# Altium footprint library Miscellaneous.PcbLib: 139 footprints (part 4 of 9)
Each footprint in its own frame and in the unit in brackets; x right, y up, seen from the top. Pads: shape width x height; smd on the part's side, far side on the other; paste and mask are expansions set on the pad; w line width, h text height; cw(c..) or ccw(c..) is an arc to the next point about the centre after c.
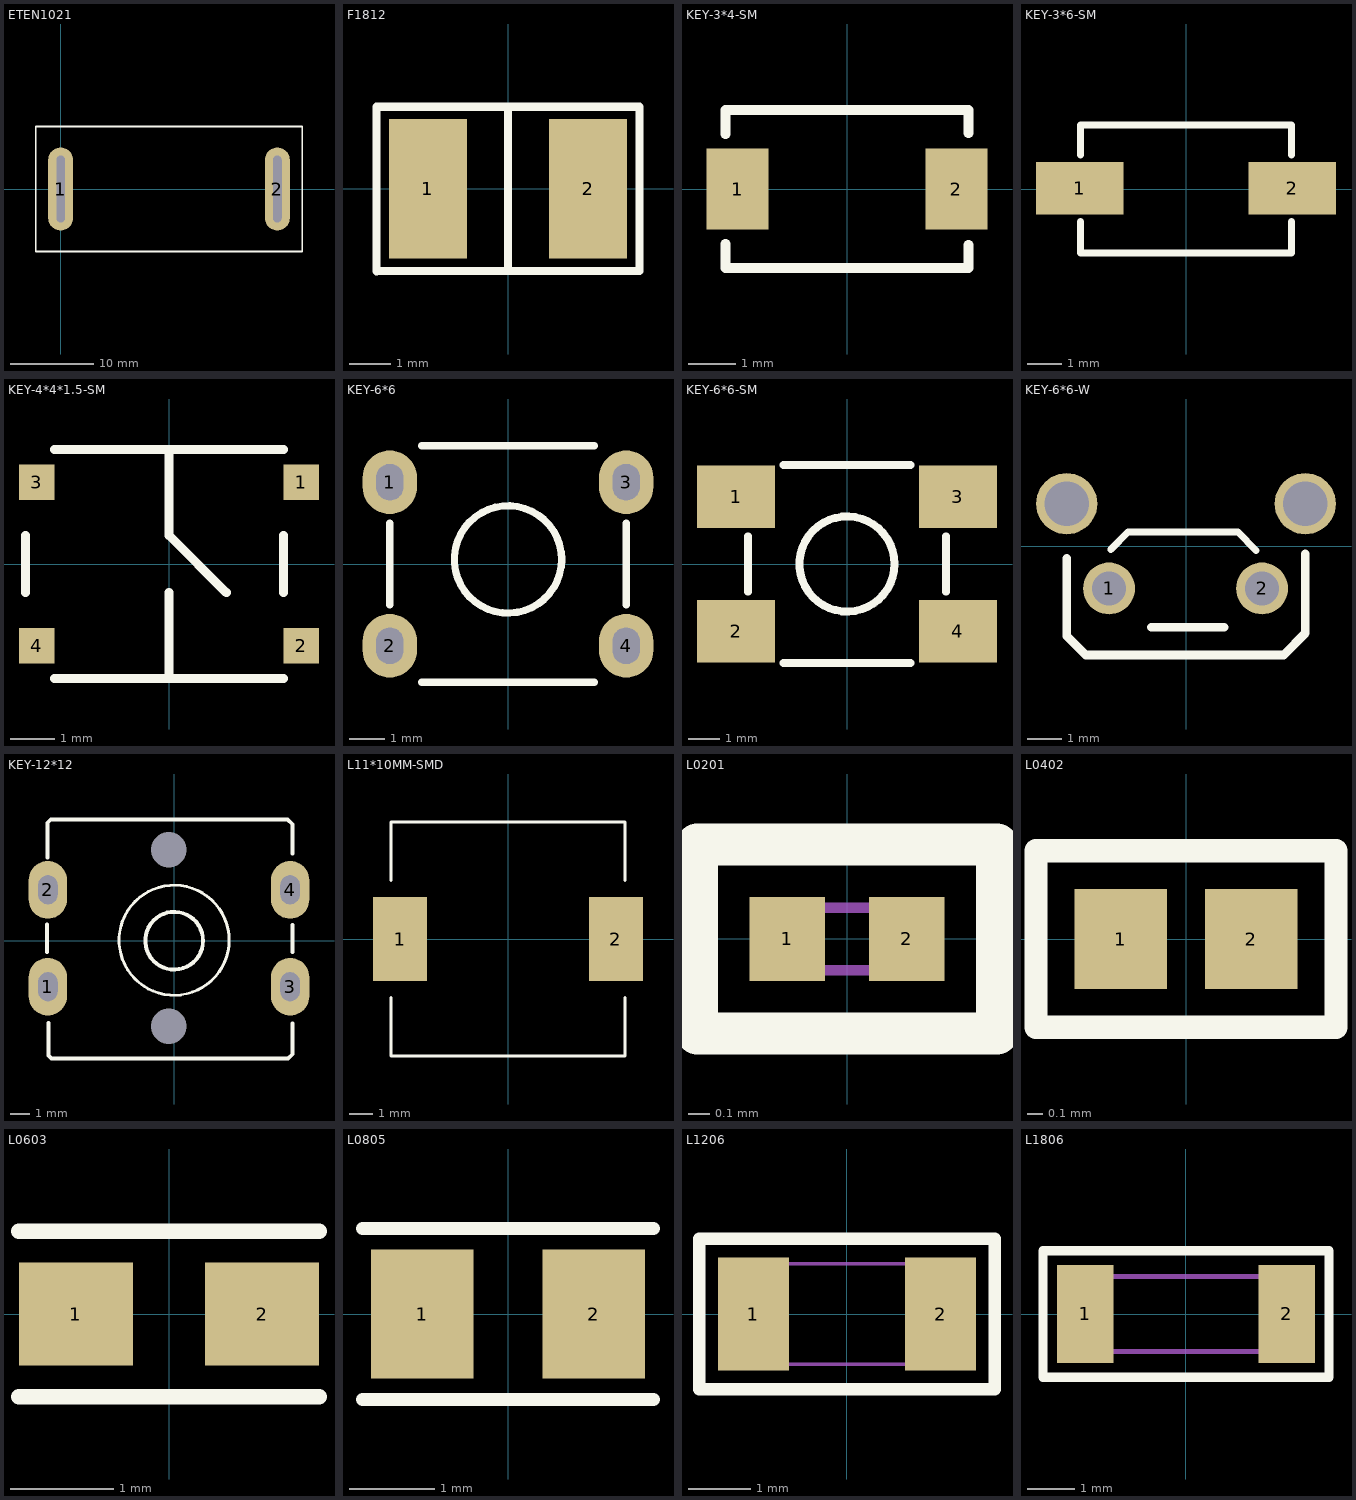
[diagram p3: the footprints below, top view; thin cyan lines are the x and y axes]

## ETEN1021 [mm]
height 44
pads (2):
  oval 3x10 hole 1 slot 8 at 90 deg: 1(0,0) 2(26,0)
Top Overlay:
  lines w0.203: -3,-7.5 -3,0 -3,7.5 29.007,7.5 29.007,0 29.007,-7.5 -3,-7.5

## F1812 [mm]
pads (2):
  rect 1.9x3.4 smd: 1(-1.95,0) 2(1.95,0)
Top Overlay:
  lines w0.203: -3.2,-2.007 -3.2,1.981 ; -3.2,-2 3.2,-2 ; -3.2,2 3.2,2 ; 0,-2 0,2 ; 3.2,-1.981 3.2,1.981
3D body "User Library-fuse1812.step": height 1.32, standoff 0, extent -2.435,-1.61 2.385,1.61

## KEY-3*4-SM [mm]
pads (2):
  rect 1.3x1.7 smd: 1(-2.286,0) 2(2.286,0)
Top Overlay:
  lines w0.2: -2.54,-1.651 2.54,-1.651 ; -2.54,1.651 2.54,1.651
  lines w0.203: -2.54,-1.651 -2.54,-1.143 ; -2.54,1.143 -2.54,1.651 ; 2.54,-1.651 2.54,-1.168 ; 2.54,1.168 2.54,1.651
3D body "User Library-OMRON B3U1000P.step": height 1.6, standoff 0, extent -2,-1.25 2,1.25

## KEY-3*6-SM [mil]
pads (2):
  rect 100x60 smd: 1(-122,1) 2(121,1)
Top Overlay:
  lines w7.87: -121,-37 -121,-73 120,-73 120,-37 ; -121,39 -121,73 120,73 120,39
3D body "User Library-Tact switch 1181_3.step": height 94.49, standoff -3.94, extent -157.47,-70.86 157.49,70.88

## KEY-4*4*1.5-SM [mm]
pads (4):
  rect 0.8x0.8 smd: 1(3,1.85) 2(3,-1.85) 3(-3,1.85) 4(-3,-1.85)
Top Overlay:
  lines w0.203: -3.25,-0.65 -3.25,0.65 ; -2.6,-2.6 2.6,-2.6 ; -2.6,2.6 2.6,2.6 ; 0,-2.6 0,-0.65 ; 0,2.6 0,1.3 0,0.65 1.3,-0.65 ; 2.6,-0.65 2.6,0.65
3D body "User Library-button1.step": height 1.55, standoff 0.05, extent -3.251,-2.65 3.152,2.65

## KEY-6*6 [mil]
pads (4):
  oval 60x70 hole 30 slot 40 at 90 deg: 1(-130,90) 2(-130,-90) 3(130,90) 4(130,-90)
Top Overlay:
  circle w8: c0,5 r59.06
  lines w8: -130,-45 -130,45 ; -95,-130 95,-130 ; -95,130 95,130 ; 130,-45 130,45
3D body "User Library-Touche DTS-6X.step": height 157.48, standoff -140.04, extent -155.9,-122.05 155.9,122.05

## KEY-6*6-SM [mm]
pads (4):
  rect 2.5x2 smd: 1(-3.556,2.159) 2(-3.556,-2.159) 3(3.556,2.159) 4(3.556,-2.159)
Top Overlay:
  circle w0.254: c0,0 r1.524
  lines w0.25: -3.175,-0.889 -3.175,0.889 ; -2.032,-3.175 2.032,-3.175 ; -2.032,3.175 2.032,3.175 ; 3.175,-0.889 3.175,0.889
3D body "User Library-switch.step": height 5, standoff 0, extent -4.5,-3 4.5,3

## KEY-6*6-W [mil]
pads (4):
  round 60 hole 39.37: 1(-89,-49) 2(88,-49)
  round 70.87 hole 51.18: ""(-138,49) ""(138,49)
Top Overlay:
  lines w7.99: -87,-4 -67,16 51,16 60,16 81,-5
  lines w10: -138,-14 -138,-104 -116,-126 113,-126 138,-101 138,-9 ; -40,-94 44,-94
3D body "k0001.stp": height 279.53, standoff -137.8, extent -143.67,-206 147.67,61.72

## KEY-12*12 [mm]
pads (6):
  oval 2x3 hole 1 slot 1.5 at 90 deg: 1(-6.553,-2.388) 2(-6.553,2.642) 3(6.02,-2.388) 4(6.02,2.642)
  round 0 hole 1.85: ""(-0.279,-4.445)
  round 0 hole 1.85 unplated: ""(-0.279,4.724)
Top Overlay:
  circle w0.152: c0,0.025 r2.856
  circle w0.203: c0.001,0 r1.5
  lines w0.203: -6.604,-0.584 -6.604,0.838 ; -6.579,4.318 -6.579,6.121 -6.534,6.166 -6.445,6.255 -6.401,6.299 5.893,6.299 6.147,6.045 6.147,4.521 ; -6.528,-4.267 -6.528,-5.969 -6.375,-6.121 5.918,-6.121 6.147,-5.893 6.147,-4.293 ; 6.147,-0.584 6.147,0.813
3D body "User Library-SWT9-1.step": height 8.32, standoff -2.48, extent -6.731,-5.949 6.269,6.051

## L11*10MM-SMD [mm] "Inductor,10uH 8A"
height 9.3
pads (2):
  rect 2.3x3.6 smd: 1(-4.6,0) 2(4.6,0)
Top Overlay:
  lines w0.127: -5,-2.5 -5,-5 5,-5 5,-2.5 ; -5,2.5 -5,5 5,5 5,2.5
3D body "User Library-SMPI1004HW.step": height 3.9, standoff 0, extent -5.175,-5.076 5.225,4.924

## L0201 [mm]
pads (2):
  rect 0.36x0.4 smd mask+0.051: 1(-0.285,0) 2(0.285,0)
Top Overlay:
  lines w0.2: -0.715,-0.45 0.715,-0.45 0.715,0.45 -0.715,0.45 -0.715,-0.45
Mechanical 13:
  lines w0.05: -0.3,-0.15 -0.3,0.15 0.3,0.15 0.3,-0.15 -0.3,-0.15
3D body "L0201.STEP": height 0.28, standoff 0, extent -0.3,-0.15 0.3,0.15

## L0402 [mm]
pads (2):
  rect 0.6x0.65 smd mask+0.051: 1(-0.425,0) 2(0.425,0)
Top Overlay:
  lines w0.152: -0.975,-0.575 -0.975,0.575 0.975,0.575 0.975,-0.575 -0.975,-0.575
3D body "L0402.STEP": height 0.36, standoff -0.01, extent -0.512,-0.262 0.538,0.263

## L0603 [mm]
pads (2):
  rect 1.1x1 smd: 1(-0.9,0) 2(0.9,0)
Top Overlay:
  lines w0.152: -1.45,-0.8 1.45,-0.8 ; -1.45,0.8 0,0.8 1.45,0.8
3D body "0603.STEP": height 0.46, standoff 0, extent -0.762,-0.386 0.762,0.381

## L0805 [mm]
pads (2):
  rect 1.2x1.5 smd: 1(-1,0) 2(1,0)
Top Overlay:
  lines w0.152: -1.7,-1 1.7,-1 ; -1.7,1 1.7,1
3D body "0805.STEP": height 0.61, standoff 0, extent -0.95,-0.65 1.082,0.625

## L1206 [mm]
pads (2):
  rect 1.13x1.8 smd: 1(-1.49,0) 2(1.49,0)
Top Overlay:
  lines w0.2: -2.355,-1.2 -2.355,1.2 2.355,1.2 2.355,-1.2 -2.355,-1.2
Mechanical 13:
  lines w0.05: -1.6,-0.8 -1.6,0.8 1.6,0.8 1.6,-0.8 -1.6,-0.8

## L1806 [mm]
pads (2):
  rect 1.2x2.1 smd: 1(-2.15,0) 2(2.15,0)
Top Overlay:
  lines w0.2: -3.05,-1.35 -3.05,1.35 3.05,1.35 3.05,-1.35 -3.05,-1.35
Mechanical 13:
  lines w0.1: -2.25,-0.8 -2.25,0.8 2.25,0.8 2.25,-0.8 -2.25,-0.8